# Altium footprint library Tomra_Cadstar_Footprints.PcbLib: 373 footprints (part 5 of 24)
Each footprint in its own frame and in the unit in brackets; x right, y up, seen from the top. Pads: shape width x height; smd on the part's side, far side on the other; paste and mask are expansions set on the pad; w line width, h text height; cw(c..) or ccw(c..) is an arc to the next point about the centre after c.
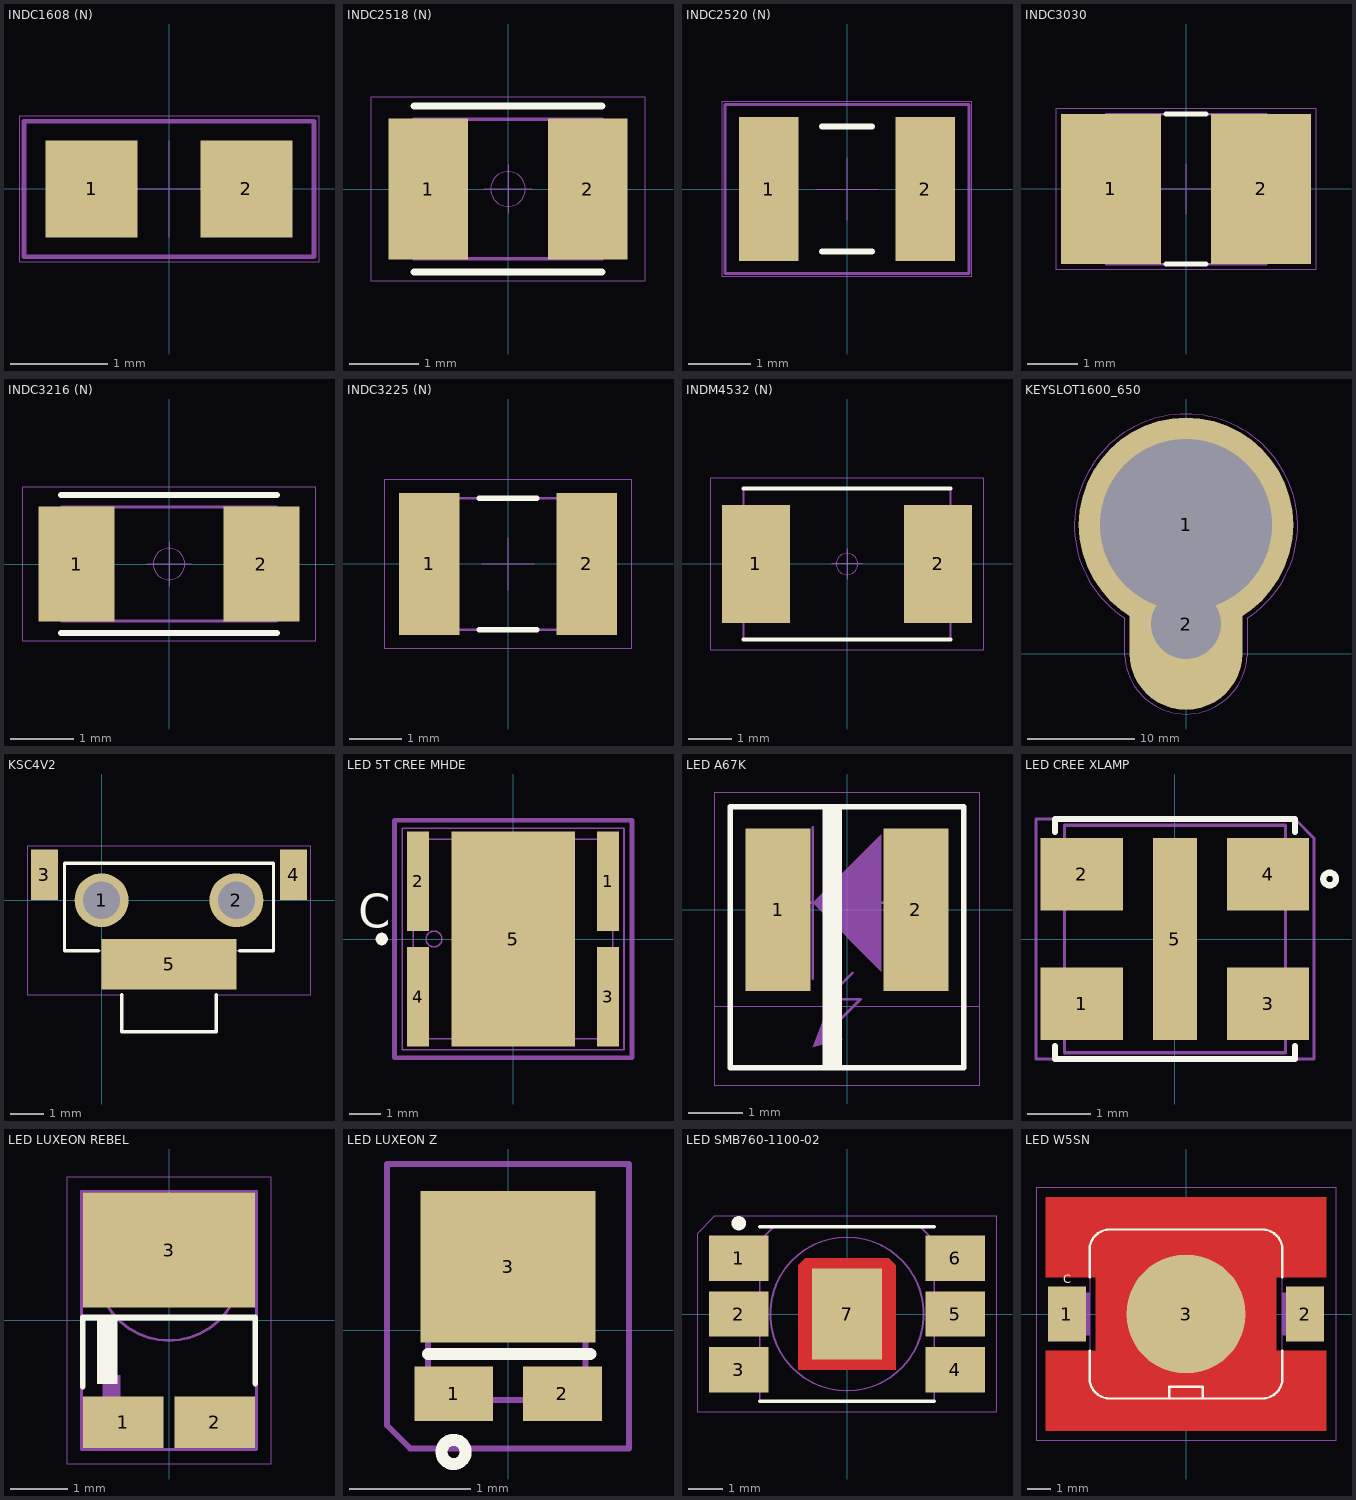
[diagram p4: the footprints below, top view; thin cyan lines are the x and y axes]

## INDC1608 (N) [mm]
height 0.95
pads (2):
  rect 0.95x1 smd paste+0 mask+0: 1(-0.8,0) 2(0.8,0)
Top Silk:
  text ".Designator" at -3.599,-0.35 h0.7
Top Assembly:
  lines w0.05: -1.5,-0.7 1.5,-0.7 1.5,0.7 -1.5,0.7 -1.5,-0.7
Top Placement:
  lines w0.01: -0.5,0 0.5,0 ; 0,-0.5 0,0.5 ; -1.55,-0.75 1.55,-0.75 1.55,0.75 -1.55,0.75 -1.55,-0.75

## INDC2518 (N) [mm]
height 2
pads (2):
  rect 1.14x2.02 smd paste+0 mask+0: 1(-1.14,0) 2(1.14,0)
Top Silk:
  lines w0.1: -1.35,-1.19 1.35,-1.19 ; -1.35,1.19 1.35,1.19
  text ".Designator" at -3.599,-0.35 h0.7
Drill:
  lines w0.05: -1.35,-1 -1.35,1 1.35,1 1.35,-1 -1.35,-1
Top Assembly:
  lines w0.05: -1.35,-1 -1.35,1 1.35,1 1.35,-1 -1.35,-1
Top Placement:
  lines w0.01: -0.35,0 0.35,0 ; 0,-0.35 0,0.35 ; -1.96,-1.32 -1.96,1.32 1.96,1.32 1.96,-1.32 -1.96,-1.32 ; -0.25,0 cw(c0,0) 0.25,0 cw(c0,0) -0.25,0

## INDC2520 (N) [mm]
height 2.2
pads (2):
  rect 0.95x2.3 smd paste+0 mask+0: 1(-1.25,0) 2(1.25,0)
Top Silk:
  lines w0.1: -0.4,-1 0.4,-1 ; -0.4,1 0.4,1
  text ".Designator" at -2,1.4 h0.7
Top Assembly:
  lines w0.05: -1.95,-1.35 1.95,-1.35 1.95,1.35 -1.95,1.35 -1.95,-1.35
Top Placement:
  lines w0.01: -0.5,0 0.5,0 ; 0,-0.5 0,0.5 ; -2,-1.4 2,-1.4 2,1.4 -2,1.4 -2,-1.4

## INDC3030 [mm]
height 2
pads (2):
  rect 2x3 smd paste+0 mask+0: 1(-1.5,0) 2(1.5,0)
Top Silk:
  lines w0.1: -0.4,-1.5 0.4,-1.5 ; -0.4,1.5 0.4,1.5
  text ".Designator" at -3.599,-0.35 h0.7
Top Assembly:
  lines w0.05: -1.595,-1.505 1.605,-1.505 1.605,1.495 -1.595,1.495 -1.595,-1.505
Top Placement:
  lines w0.01: -0.5,0 0.5,0 ; 0,-0.5 0,0.5 ; -2.6,-1.6 2.6,-1.6 2.6,1.6 -2.6,1.6 -2.6,-1.6

## INDC3216 (N) [mm]
height 1.3
pads (2):
  rect 1.2x1.82 smd paste+0 mask+0: 1(-1.46,0) 2(1.46,0)
Top Silk:
  lines w0.1: -1.7,-1.09 1.7,-1.09 ; -1.7,1.09 1.7,1.09
  text ".Designator" at -3.599,-0.35 h0.7
Drill:
  lines w0.05: -1.7,-0.9 -1.7,0.9 1.7,0.9 1.7,-0.9 -1.7,-0.9
Top Assembly:
  lines w0.05: -1.7,-0.9 -1.7,0.9 1.7,0.9 1.7,-0.9 -1.7,-0.9
Top Placement:
  lines w0.01: -0.35,0 0.35,0 ; 0,-0.35 0,0.35 ; -2.31,-1.22 -2.31,1.22 2.31,1.22 2.31,-1.22 -2.31,-1.22 ; -0.25,0 cw(c0,0) 0.25,0 cw(c0,0) -0.25,0

## INDC3225 (N) [mm]
height 1.35
pads (2):
  rect 1.15x2.7 smd paste+0 mask+0: 1(-1.5,0) 2(1.5,0)
Top Silk:
  lines w0.1: -0.55,-1.25 0.55,-1.25 ; -0.55,1.25 0.55,1.25
  text ".Designator" at -3.599,-0.35 h0.7
Top Assembly:
  lines w0.05: -1.6,-1.25 1.6,-1.25 1.6,1.25 -1.6,1.25 -1.6,-1.25
Top Placement:
  lines w0.01: -0.5,0 0.5,0 ; 0,-0.5 0,0.5 ; -2.35,-1.6 2.35,-1.6 2.35,1.6 -2.35,1.6 -2.35,-1.6

## INDM4532 (N) [mm]
height 3.4
pads (2):
  rrect0% 1.58x2.73 smd paste+0 mask+0: 1(-2.115,0) 2(2.115,0)
Top Silk:
  lines w0.1: -2.4,-1.75 2.4,-1.75 ; -2.4,1.75 2.4,1.75
  text ".Designator" at -2.4,1.75 h0.7
Top Assembly:
  lines w0.05: -2.4,-1.75 -2.4,1.75 ; -2.4,-1.75 2.4,-1.75 ; -2.4,-1.75 -2.4,1.75 ; -2.4,-1.75 2.4,-1.75 ; -2.4,1.75 2.4,1.75 ; -2.4,1.75 2.4,1.75 ; 2.4,-1.75 2.4,1.75 ; 2.4,-1.75 2.4,1.75
Top Placement:
  lines w0.01: -0.35,0 0.35,0 ; 0,-0.35 0,0.35 ; -3.16,-2 -3.16,2 3.16,2 3.16,-2 -3.16,-2 ; -0.25,0 cw(c0,0) 0.25,0 cw(c0,0) -0.25,0

## KEYSLOT1600_650 [mm]
pads (2):
  round 20 / inner round 1.524 / far side round 20 hole 16 paste+0 mask+0: 1(0,12)
  oval 10.5x16 / inner round 1.524 / far side oval 10.5x16 hole 6.5 paste+0 mask+0: 2(0,2.75)
Top Assembly:
  text ".Designator" at 0,0 h0.7
Top Placement:
  lines w0.01: -10.4,12.1 cw(c0,11.929) 10.4,12.1 cw(c0.119,11.936) 5.7,3.3 5.7,-0.2 cw(c0,0.075) -5.7,-0.2 -5.7,3.3 cw(c-0.133,11.929) -10.4,12.1

## KSC4V2 [mm]
height 6.7
pads (5):
  round 1.6 / inner round 1.524 / far side round 1.6 hole 1.1 paste+0 mask+0: 1(0,0) 2(4,0)
  rrect0% 0.8x1.5 smd paste+0 mask+0: 3(-1.7,0.75) 4(5.7,0.75)
  rect 4x1.5 smd paste+0 mask+0: 5(2,-1.9)
Top Silk:
  lines w0.1: -0.1,-1.5 -1.1,-1.5 -1.1,1.1 5.1,1.1 5.1,-1.5 4.1,-1.5 ; 0.6,-2.8 0.6,-3.9 3.4,-3.9 3.4,-2.8
  text ".Designator" at -1.599,1.65 h0.7
Top Assembly:
  lines w0.05: -1.1,-1.5 5.1,-1.5 5.1,1.1 -1.1,1.1 -1.1,-1.5
Top Placement:
  lines w0.01: -2.2,-2.8 -2.2,1.6 6.2,1.6 6.2,-2.8 3.4,-2.8 3.4,-3.9 0.6,-3.9 0.6,-2.8 -2.2,-2.8

## LED 5T CREE MHDE [mm]
height 1.79
pads (5):
  rect 0.7x3.15 smd paste+0 mask+0.1: 1(3,1.825) 2(-3,1.825) 3(3,-1.825) 4(-3,-1.825)
  rect 3.9x6.8 smd paste-3.9 mask+0.1: 5(0,0)
Top Silk:
  region: -4.15,-0.194 -4.189,-0.194 -4.26,-0.164 -4.314,-0.11 -4.344,-0.039 -4.344,0.039 -4.314,0.11 -4.26,0.164 -4.189,0.194 -4.15,0.194 -4.111,0.194 -4.04,0.164 -3.986,0.11 -3.956,0.039 -3.956,-0.039 -3.986,-0.11 -4.04,-0.164 -4.111,-0.194
  text ".Designator" at -3.55,4.4 h1.07
  text ".Comment" at -3.55,-7.8 h1.07
  text "C" at -4.9,0.35 h1.07
Top Paste:
  region: -1.315,1.715 -0.175,1.715 -0.175,2.905 -1.315,2.905
  region: -1.315,-1.365 -0.175,-1.365 -0.175,-0.175 -1.315,-0.175
  region: 0.175,1.715 1.315,1.715 1.315,2.905 0.175,2.905
  region: -1.315,-2.905 -0.175,-2.905 -0.175,-1.715 -1.315,-1.715
  region: 0.175,-2.905 1.315,-2.905 1.315,-1.715 0.175,-1.715
  region: 0.175,0.175 1.315,0.175 1.315,1.365 0.175,1.365
  region: -1.315,0.175 -0.175,0.175 -0.175,1.365 -1.315,1.365
  region: 0.175,-1.365 1.315,-1.365 1.315,-0.175 0.175,-0.175
Top Assembly:
  lines w0.05: -3.5,-3.5 -3.5,3.5 3.5,3.5 3.5,-3.5 -3.5,-3.5 ; -3.15,-3.15 -3.15,3.15 3.15,3.15 3.15,-3.15 -3.15,-3.15 ; -2.5,-0.25 ccw(c-2.5,0) -2.5,0.25 ccw(c-2.5,0) -2.5,-0.25
Top Placement:
  lines w0.15: -3.75,-3.75 -3.75,3.75 3.75,3.75 3.75,-3.75 -3.75,-3.75

## LED A67K [mm]
height 4.2
pads (2):
  rect 1.2x3 smd paste+0 mask+0: 1(-1.27,0) 2(1.27,0)
Top Silk:
  region: -0.45,-2.921 -0.1,-2.921 -0.1,1.86 -0.45,1.86
  lines w0.1: -2.159,-2.921 -2.159,1.905 2.159,1.905 2.159,-2.921 -2.159,-2.921
Top Assembly:
  region: -0.635,-2.54 -0.432,-2.007 -0.076,-2.388
  region: -0.635,0.127 0.635,1.397 0.635,-1.143
  lines w0.05: -1.524,0.127 1.397,0.127 ; -0.635,-1.27 -0.635,1.524 ; -0.508,-2.413 0.254,-1.651 -0.381,-1.651 0.102,-1.168 ; -2.159,-2.921 -2.159,1.905 2.159,1.905 2.159,-2.921 -2.159,-2.921
  text ".Designator" at -2.15,2.16 h0.7
Top Placement:
  lines w0.01: -2.45,-1.778 2.45,-1.778 ; -2.45,-3.24 -2.45,2.16 2.45,2.16 2.45,-3.24 -2.45,-3.24

## LED CREE XLAMP [mm]
height 1.2
pads (5):
  rect 1.3x1.15 smd paste+0 mask+0: 1(-1.475,-1.025) 2(-1.475,1.025) 3(1.475,-1.025) 4(1.475,1.025)
  rect 0.7x3.2 smd paste+0 mask+0: 5(0,0)
Top Silk:
  lines w0.1: -1.9,-1.7 -1.9,-1.9 1.9,-1.9 1.9,-1.7 ; -1.9,1.7 -1.9,1.9 1.9,1.9 1.9,1.7 ; 2.45,0.85 cw(c2.45,0.95) 2.45,1.05 cw(c2.45,0.95) 2.45,0.85
  text ".Designator" at -4.45,2.05 h0.7
Top Assembly:
  lines w0.05: -1.75,-1.8 1.75,-1.8 1.75,1.8 -1.75,1.8 -1.75,-1.8
Top Placement:
  lines w0.05: -2.2,-1.9 2.2,-1.9 2.2,1.6 1.9,1.9 -2.2,1.9 -2.2,-1.9

## LED LUXEON REBEL [mm]
height 2.1
pads (3):
  rect 1.4x0.9 smd paste+0 mask+0: 1(-0.8,-1.775) 2(0.8,-1.775)
  rect 3x2 smd paste+0 mask+0: 3(0,1.225)
Top Silk:
  region: -1.25,-1.1 -0.9,-1.1 -0.9,0 -1.25,0
  lines w0.1: -1.5,-1.15 -1.5,0.05 1.5,0.05 1.5,-1.1
  text ".Designator" at -1.15,2.25 h0.7
Top Assembly:
  region: -1.15,-2.25 -0.85,-2.25 -0.85,-0.95 -1.15,-0.95
  lines w0.05: -1.525,-2.25 1.525,-2.25 1.525,2.25 -1.525,2.25 -1.525,-2.25 ; 0,-0.35 cw(c0,0.9) 0,2.15 cw(c0,0.9) 0,-0.35
Top Placement:
  lines w0.01: -1.775,-2.5 1.775,-2.5 1.775,2.5 -1.775,2.5 -1.775,-2.5

## LED LUXEON Z [mm]
height 0.79
pads (3):
  rect 0.65x0.45 smd paste+0 mask+0: 1(-0.45,-0.525) 2(0.45,-0.525)
  rect 1.45x1.25 smd paste+0 mask+0: 3(0,0.525)
Top Silk:
  lines w0.1: -0.66,-0.195 0.68,-0.195 ; -0.45,-1.105 cw(c-0.45,-1.005) -0.45,-0.905 cw(c-0.45,-1.005) -0.45,-1.105
  text ".Designator" at -1.15,2.25 h0.7
Top Assembly:
  lines w0.05: -0.66,-0.455 -0.54,-0.575 0.64,-0.575 0.64,1.125 -0.66,1.125 -0.66,-0.455
Top Placement:
  lines w0.05: -1,-0.785 -0.81,-0.975 1,-0.975 1,1.375 -1,1.375 -1,-0.785

## LED SMB760-1100-02 [mm]
height 7.5
pads (7):
  rect 1.7x1.3 smd paste+0 mask+0: 1(-3.1,1.6) 2(-3.1,0) 3(-3.1,-1.6) 4(3.1,-1.6) 5(3.1,0) 6(3.1,1.6)
  rect 2x2.6 smd paste+0 mask+0: 7(0,0)
Top Elec:
  region: 1.4,-1.6 1.4,1.4 1.2,1.6 -1.2,1.6 -1.4,1.4 -1.4,-1.6
Top Silk:
  region: -3.1,2.4 -3.14,2.4 -3.213,2.43 -3.27,2.487 -3.3,2.56 -3.3,2.64 -3.27,2.713 -3.213,2.77 -3.14,2.8 -3.1,2.8 -3.06,2.8 -2.987,2.77 -2.93,2.713 -2.9,2.64 -2.9,2.56 -2.93,2.487 -2.987,2.43 -3.06,2.4
  lines w0.1: -2.5,-2.5 2.5,-2.5 ; -2.5,2.5 2.5,2.5
  text ".Designator" at -2.5,2.5 h0.7
Top Paste:
  region: 1.4,-1.6 1.4,1.4 1.2,1.6 -1.2,1.6 -1.4,1.4 -1.4,-1.6
Top Solder Resist:
  region: 1.4,-1.6 1.4,1.4 1.2,1.6 -1.2,1.6 -1.4,1.4 -1.4,-1.6
Drill:
  lines w0.05: 0,-0.7 cw(c0,0) 0,0.7 cw(c0,0) 0,-0.7
Top Assembly:
  region: -3.7,1.2 -2.5,1.2 -2.5,2 -3.7,2
  region: 2.5,1.2 3.7,1.2 3.7,2 2.5,2
  region: -3.7,-0.4 -2.5,-0.4 -2.5,0.4 -3.7,0.4
  region: 2.5,-0.4 3.7,-0.4 3.7,0.4 2.5,0.4
  region: -3.7,-2 -2.5,-2 -2.5,-1.2 -3.7,-1.2
  region: 2.5,-2 3.7,-2 3.7,-1.2 2.5,-1.2
  lines w0.05: -2.5,-2.5 2.5,-2.5 2.5,2.1 2.1,2.5 -2.1,2.5 -2.5,2.1 -2.5,-2.5 ; 0,-2.2 cw(c0,0) 0,2.2 cw(c0,0) 0,-2.2
Top Placement:
  lines w0.01: -4.3,-2.8 4.3,-2.8 4.3,2.8 -3.8,2.8 -4.3,2.3 -4.3,-2.8

## LED W5SN [mm]
pads (3):
  rrect0% 1.6x2.3 smd paste+0 mask+0: 1(-5,0) 2(5,0)
  round 5 smd paste-2.5 mask-2.5: 3(0,0)
Top Elec:
  region: -5.9,4.9 5.9,4.9 5.9,1.55 3.8,1.55 3.8,-1.55 5.9,-1.55 5.9,-4.9 -5.9,-4.9 -5.9,-1.55 -3.8,-1.55 -3.8,1.55 -5.9,1.55
Top Silk:
  lines w0.1: -4.05,-1.55 -4.05,-2.7 ccw(c-3.2,-2.7) -3.2,-3.55 3.2,-3.55 ccw(c3.2,-2.7) 4.05,-2.7 4.05,-1.55 ; -4.05,1.55 -4.05,2.7 cw(c-3.2,2.7) -3.2,3.55 3.2,3.55 cw(c3.2,2.7) 4.05,2.7 4.05,1.55 ; -0.7,-3.55 0.7,-3.55 0.7,-3.05 -0.7,-3.05 -0.7,-3.55 ; 0,-2 cw(c0,0) 0,2 cw(c0,0) 0,-2 ; 0,-1.35 cw(c0,0) 0,1.35 cw(c0,0) 0,-1.35
  text "C" at -5.15,1.3 h0.35
  text ".Designator" at -3.09,2.51 h0.7
Top Paste:
  region: 0,-1.15 -0.151,-1.15 -0.444,-1.072 -0.706,-0.92 -0.92,-0.706 -1.072,-0.444 -1.15,-0.151 -1.15,0.151 -1.072,0.444 -0.92,0.706 -0.706,0.92 -0.444,1.072 -0.151,1.15 0,1.15 0.151,1.15 0.444,1.072 0.706,0.92 0.92,0.706 1.072,0.444 1.15,0.151 1.15,-0.151 1.072,-0.444 0.92,-0.706 0.706,-0.92 0.444,-1.072 0.151,-1.15
Top Assembly:
  region: 0,-1.6 -0.158,-1.6 -0.467,-1.539 -0.758,-1.418 -1.02,-1.243 -1.243,-1.02 -1.418,-0.758 -1.539,-0.467 -1.6,-0.158 -1.6,0.158 -1.539,0.467 -1.418,0.758 -1.243,1.02 -1.02,1.243 -0.758,1.418 -0.467,1.539 -0.158,1.6 0,1.6 0.158,1.6 0.467,1.539 0.758,1.418 1.02,1.243 1.243,1.02 1.418,0.758 1.539,0.467 1.6,0.158 1.6,-0.158 1.539,-0.467 1.418,-0.758 1.243,-1.02 1.02,-1.243 0.758,-1.418 0.467,-1.539 0.158,-1.6
  region: 4.05,0.9 5.55,0.9 5.55,-0.9 4.05,-0.9
  region: -5.55,0.9 -4.05,0.9 -4.05,-0.9 -5.55,-0.9
  lines w0.05: -4.05,-2.7 ccw(c-3.2,-2.7) -3.2,-3.55 3.2,-3.55 ccw(c3.2,-2.7) 4.05,-2.7 4.05,2.7 ccw(c3.2,2.7) 3.2,3.55 -3.2,3.55 ccw(c-3.2,2.7) -4.05,2.7 -4.05,-2.7 ; -0.7,-3.55 0.7,-3.55 0.7,-3.05 -0.7,-3.05 -0.7,-3.55
  text "Catode" at -2.05,-2.7 h0.35
Top Placement:
  lines w0.01: -6.3,-5.3 6.3,-5.3 6.3,5.3 -6.3,5.3 -6.3,-5.3